# Altium footprint library 常用元件封装库.PcbLib: 1310 footprints (part 73 of 83)
Each footprint in its own frame and in the unit in brackets; x right, y up, seen from the top. Pads: shape width x height; smd on the part's side, far side on the other; paste and mask are expansions set on the pad; w line width, h text height; cw(c..) or ccw(c..) is an arc to the next point about the centre after c.
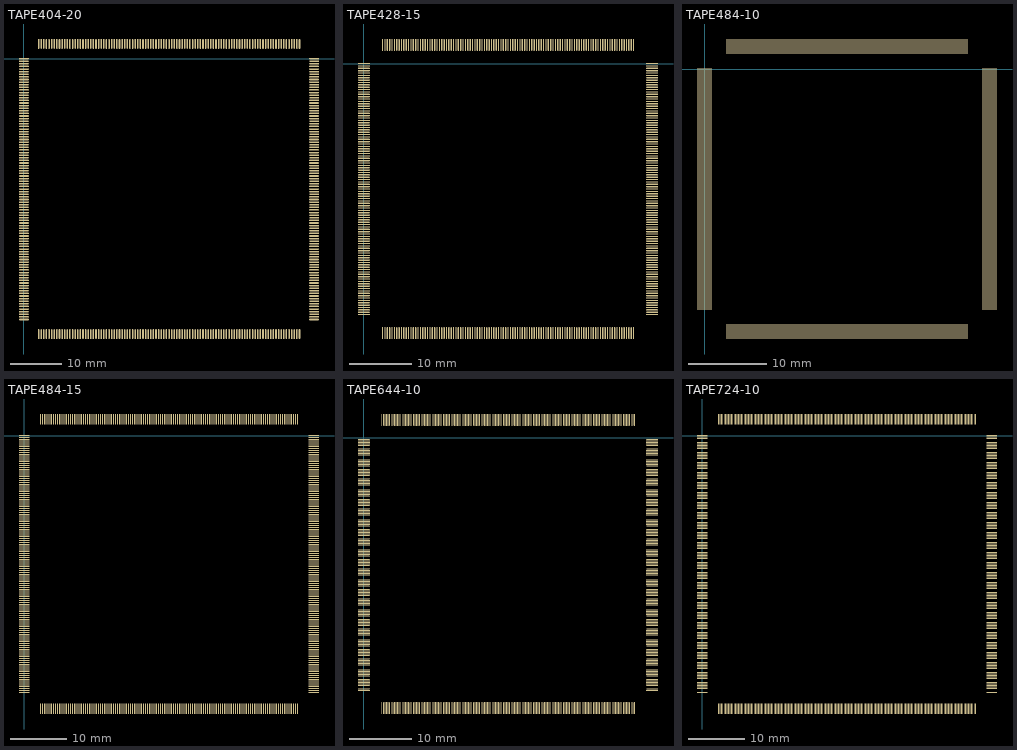
[diagram p72: the footprints below, top view; thin cyan lines are the x and y axes]

## TAPE404-20 [mil]
pads (404):
  oval 75x12 smd: 1(0,0) 2(0,-20) 3(0,-40) 4(0,-60) 5(0,-80) 6(0,-100) 7(0,-120) 8(0,-140) 9(0,-160) 10(0,-180) 11(0,-200) 12(0,-220) 13(0,-240) 14(0,-260) 15(0,-280) 16(0,-300) 17(0,-320) 18(0,-340) 19(0,-360) 20(0,-380) 21(0,-400) 22(0,-420) 23(0,-440) 24(0,-460) 25(0,-480) 26(0,-500) 27(0,-520) 28(0,-540) 29(0,-560) 30(0,-580) 31(0,-600) 32(0,-620) 33(0,-640) 34(0,-660) 35(0,-680) 36(0,-700) 37(0,-720) 38(0,-740) 39(0,-760) 40(0,-780) 41(0,-800) 42(0,-820) 43(0,-840) 44(0,-860) 45(0,-880) 46(0,-900) 47(0,-920) 48(0,-940) 49(0,-960) 50(0,-980) 51(0,-1000) 52(0,-1020) 53(0,-1040) 54(0,-1060) 55(0,-1080) 56(0,-1100) 57(0,-1120) 58(0,-1140) 59(0,-1160) 60(0,-1180) 61(0,-1200) 62(0,-1220) 63(0,-1240) 64(0,-1260) 65(0,-1280) 66(0,-1300) 67(0,-1320) 68(0,-1340) 69(0,-1360) 70(0,-1380) 71(0,-1400) 72(0,-1420) 73(0,-1440) 74(0,-1460) 75(0,-1480) 76(0,-1500) 77(0,-1520) 78(0,-1540) 79(0,-1560) 80(0,-1580) 81(0,-1600) 82(0,-1620) 83(0,-1640) 84(0,-1660) 85(0,-1680) 86(0,-1700) 87(0,-1720) 88(0,-1740) 89(0,-1760) 90(0,-1780) 91(0,-1800) 92(0,-1820) 93(0,-1840) 94(0,-1860) 95(0,-1880) 96(0,-1900) 97(0,-1920) 98(0,-1940) 99(0,-1960) 100(0,-1980) 101(0,-2000) 203(2225,-2000) 204(2225,-1980) 205(2225,-1960) 206(2225,-1940) 207(2225,-1920) 208(2225,-1900) 209(2225,-1880) 210(2225,-1860) 211(2225,-1840) 212(2225,-1820) 213(2225,-1800) 214(2225,-1780) 215(2225,-1760) 216(2225,-1740) 217(2225,-1720) 218(2225,-1700) 219(2225,-1680) 220(2225,-1660) 221(2225,-1640) 222(2225,-1620) 223(2225,-1600) 224(2225,-1580) 225(2225,-1560) 226(2225,-1540) 227(2225,-1520) 228(2225,-1500) 229(2225,-1480) 230(2225,-1460) 231(2225,-1440) 232(2225,-1420) 233(2225,-1400) 234(2225,-1380) 235(2225,-1360) 236(2225,-1340) 237(2225,-1320) 238(2225,-1300) 239(2225,-1280) 240(2225,-1260) 241(2225,-1240) 242(2225,-1220) 243(2225,-1200) 244(2225,-1180) 245(2225,-1160) 246(2225,-1140) 247(2225,-1120) 248(2225,-1100) 249(2225,-1080) 250(2225,-1060) 251(2225,-1040) 252(2225,-1020) 253(2225,-1000) 254(2225,-980) 255(2225,-960) 256(2225,-940) 257(2225,-920) 258(2225,-900) 259(2225,-880) 260(2225,-860) 261(2225,-840) 262(2225,-820) 263(2225,-800) 264(2225,-780) 265(2225,-760) 266(2225,-740) 267(2225,-720) 268(2225,-700) 269(2225,-680) 270(2225,-660) 271(2225,-640) 272(2225,-620) 273(2225,-600) 274(2225,-580) 275(2225,-560) 276(2225,-540) 277(2225,-520) 278(2225,-500) 279(2225,-480) 280(2225,-460) 281(2225,-440) 282(2225,-420) 283(2225,-400) 284(2225,-380) 285(2225,-360) 286(2225,-340) 287(2225,-320) 288(2225,-300) 289(2225,-280) 290(2225,-260) 291(2225,-240) 292(2225,-220) 293(2225,-200) 294(2225,-180) 295(2225,-160) 296(2225,-140) 297(2225,-120) 298(2225,-100) 299(2225,-80) 300(2225,-60) 301(2225,-40) 302(2225,-20) 303(2225,0)
  oval 12x75 smd: 102(113,-2112) 103(133,-2112) 104(153,-2112) 105(173,-2112) 106(193,-2112) 107(213,-2112) 108(233,-2112) 109(253,-2112) 110(273,-2112) 111(293,-2112) 112(313,-2112) 113(333,-2112) 114(353,-2112) 115(373,-2112) 116(393,-2112) 117(413,-2112) 118(433,-2112) 119(453,-2112) 120(473,-2112) 121(493,-2112) 122(513,-2112) 123(533,-2112) 124(553,-2112) 125(573,-2112) 126(593,-2112) 127(613,-2112) 128(633,-2112) 129(653,-2112) 130(673,-2112) 131(693,-2112) 132(713,-2112) 133(733,-2112) 134(753,-2112) 135(773,-2112) 136(793,-2112) 137(813,-2112) 138(833,-2112) 139(853,-2112) 140(873,-2112) 141(893,-2112) 142(913,-2112) 143(933,-2112) 144(953,-2112) 145(973,-2112) 146(993,-2112) 147(1013,-2112) 148(1033,-2112) 149(1053,-2112) 150(1073,-2112) 151(1093,-2112) 152(1113,-2112) 153(1133,-2112) 154(1153,-2112) 155(1173,-2112) 156(1193,-2112) 157(1213,-2112) 158(1233,-2112) 159(1253,-2112) 160(1273,-2112) 161(1293,-2112) 162(1313,-2112) 163(1333,-2112) 164(1353,-2112) 165(1373,-2112) 166(1393,-2112) 167(1413,-2112) 168(1433,-2112) 169(1453,-2112) 170(1473,-2112) 171(1493,-2112) 172(1513,-2112) 173(1533,-2112) 174(1553,-2112) 175(1573,-2112) 176(1593,-2112) 177(1613,-2112) 178(1633,-2112) 179(1653,-2112) 180(1673,-2112) 181(1693,-2112) 182(1713,-2112) 183(1733,-2112) 184(1753,-2112) 185(1773,-2112) 186(1793,-2112) 187(1813,-2112) 188(1833,-2112) 189(1853,-2112) 190(1873,-2112) 191(1893,-2112) 192(1913,-2112) 193(1933,-2112) 194(1953,-2112) 195(1973,-2112) 196(1993,-2112) 197(2013,-2112) 198(2033,-2112) 199(2053,-2112) 200(2073,-2112) 201(2093,-2112) 202(2113,-2112) 304(2113,113) 305(2093,113) 306(2073,113) 307(2053,113) 308(2033,113) 309(2013,113) 310(1993,113) 311(1973,113) 312(1953,113) 313(1933,113) 314(1913,113) 315(1893,113) 316(1873,113) 317(1853,113) 318(1833,113) 319(1813,113) 320(1793,113) 321(1773,113) 322(1753,113) 323(1733,113) 324(1713,113) 325(1693,113) 326(1673,113) 327(1653,113) 328(1633,113) 329(1613,113) 330(1593,113) 331(1573,113) 332(1553,113) 333(1533,113) 334(1513,113) 335(1493,113) 336(1473,113) 337(1453,113) 338(1433,113) 339(1413,113) 340(1393,113) 341(1373,113) 342(1353,113) 343(1333,113) 344(1313,113) 345(1293,113) 346(1273,113) 347(1253,113) 348(1233,113) 349(1213,113) 350(1193,113) 351(1173,113) 352(1153,113) 353(1133,113) 354(1113,113) 355(1093,113) 356(1073,113) 357(1053,113) 358(1033,113) 359(1013,113) 360(993,113) 361(973,113) 362(953,113) 363(933,113) 364(913,113) 365(893,113) 366(873,113) 367(853,113) 368(833,113) 369(813,113) 370(793,113) 371(773,113) 372(753,113) 373(733,113) 374(713,113) 375(693,113) 376(673,113) 377(653,113) 378(633,113) 379(613,113) 380(593,113) 381(573,113) 382(553,113) 383(533,113) 384(513,113) 385(493,113) 386(473,113) 387(453,113) 388(433,113) 389(413,113) 390(393,113) 391(373,113) 392(353,113) 393(333,113) 394(313,113) 395(293,113) 396(273,113) 397(253,113) 398(233,113) 399(213,113) 400(193,113) 401(173,113) 402(153,113) 403(133,113) 404(113,113)

## TAPE428-15 [mil]
pads (428):
  oval 75x8 smd: 1(0,0) 2(0,-15) 3(0,-30) 4(0,-45) 5(0,-60) 6(0,-75) 7(0,-90) 8(0,-105) 9(0,-120) 10(0,-135) 11(0,-150) 12(0,-165) 13(0,-180) 14(0,-195) 15(0,-210) 16(0,-225) 17(0,-240) 18(0,-255) 19(0,-270) 20(0,-285) 21(0,-300) 22(0,-315) 23(0,-330) 24(0,-345) 25(0,-360) 26(0,-375) 27(0,-390) 28(0,-405) 29(0,-420) 30(0,-435) 31(0,-450) 32(0,-465) 33(0,-480) 34(0,-495) 35(0,-510) 36(0,-525) 37(0,-540) 38(0,-555) 39(0,-570) 40(0,-585) 41(0,-600) 42(0,-615) 43(0,-630) 44(0,-645) 45(0,-660) 46(0,-675) 47(0,-690) 48(0,-705) 49(0,-720) 50(0,-735) 51(0,-750) 52(0,-765) 53(0,-780) 54(0,-795) 55(0,-810) 56(0,-825) 57(0,-840) 58(0,-855) 59(0,-870) 60(0,-885) 61(0,-900) 62(0,-915) 63(0,-930) 64(0,-945) 65(0,-960) 66(0,-975) 67(0,-990) 68(0,-1005) 69(0,-1020) 70(0,-1035) 71(0,-1050) 72(0,-1065) 73(0,-1080) 74(0,-1095) 75(0,-1110) 76(0,-1125) 77(0,-1140) 78(0,-1155) 79(0,-1170) 80(0,-1185) 81(0,-1200) 82(0,-1215) 83(0,-1230) 84(0,-1245) 85(0,-1260) 86(0,-1275) 87(0,-1290) 88(0,-1305) 89(0,-1320) 90(0,-1335) 91(0,-1350) 92(0,-1365) 93(0,-1380) 94(0,-1395) 95(0,-1410) 96(0,-1425) 97(0,-1440) 98(0,-1455) 99(0,-1470) 100(0,-1485) 101(0,-1500) 102(0,-1515) 103(0,-1530) 104(0,-1545) 105(0,-1560) 106(0,-1575) 107(0,-1590) 215(1825,-1590) 216(1825,-1575) 217(1825,-1560) 218(1825,-1545) 219(1825,-1530) 220(1825,-1515) 221(1825,-1500) 222(1825,-1485) 223(1825,-1470) 224(1825,-1455) 225(1825,-1440) 226(1825,-1425) 227(1825,-1410) 228(1825,-1395) 229(1825,-1380) 230(1825,-1365) 231(1825,-1350) 232(1825,-1335) 233(1825,-1320) 234(1825,-1305) 235(1825,-1290) 236(1825,-1275) 237(1825,-1260) 238(1825,-1245) 239(1825,-1230) 240(1825,-1215) 241(1825,-1200) 242(1825,-1185) 243(1825,-1170) 244(1825,-1155) 245(1825,-1140) 246(1825,-1125) 247(1825,-1110) 248(1825,-1095) 249(1825,-1080) 250(1825,-1065) 251(1825,-1050) 252(1825,-1035) 253(1825,-1020) 254(1825,-1005) 255(1825,-990) 256(1825,-975) 257(1825,-960) 258(1825,-945) 259(1825,-930) 260(1825,-915) 261(1825,-900) 262(1825,-885) 263(1825,-870) 264(1825,-855) 265(1825,-840) 266(1825,-825) 267(1825,-810) 268(1825,-795) 269(1825,-780) 270(1825,-765) 271(1825,-750) 272(1825,-735) 273(1825,-720) 274(1825,-705) 275(1825,-690) 276(1825,-675) 277(1825,-660) 278(1825,-645) 279(1825,-630) 280(1825,-615) 281(1825,-600) 282(1825,-585) 283(1825,-570) 284(1825,-555) 285(1825,-540) 286(1825,-525) 287(1825,-510) 288(1825,-495) 289(1825,-480) 290(1825,-465) 291(1825,-450) 292(1825,-435) 293(1825,-420) 294(1825,-405) 295(1825,-390) 296(1825,-375) 297(1825,-360) 298(1825,-345) 299(1825,-330) 300(1825,-315) 301(1825,-300) 302(1825,-285) 303(1825,-270) 304(1825,-255) 305(1825,-240) 306(1825,-225) 307(1825,-210) 308(1825,-195) 309(1825,-180) 310(1825,-165) 311(1825,-150) 312(1825,-135) 313(1825,-120) 314(1825,-105) 315(1825,-90) 316(1825,-75) 317(1825,-60) 318(1825,-45) 319(1825,-30) 320(1825,-15) 321(1825,0)
  oval 8x75 smd: 108(118,-1707) 109(133,-1707) 110(148,-1707) 111(163,-1707) 112(178,-1707) 113(193,-1707) 114(208,-1707) 115(223,-1707) 116(238,-1707) 117(253,-1707) 118(268,-1707) 119(283,-1707) 120(298,-1707) 121(313,-1707) 122(328,-1707) 123(343,-1707) 124(358,-1707) 125(373,-1707) 126(388,-1707) 127(403,-1707) 128(418,-1707) 129(433,-1707) 130(448,-1707) 131(463,-1707) 132(478,-1707) 133(493,-1707) 134(508,-1707) 135(523,-1707) 136(538,-1707) 137(553,-1707) 138(568,-1707) 139(583,-1707) 140(598,-1707) 141(613,-1707) 142(628,-1707) 143(643,-1707) 144(658,-1707) 145(673,-1707) 146(688,-1707) 147(703,-1707) 148(718,-1707) 149(733,-1707) 150(748,-1707) 151(763,-1707) 152(778,-1707) 153(793,-1707) 154(808,-1707) 155(823,-1707) 156(838,-1707) 157(853,-1707) 158(868,-1707) 159(883,-1707) 160(898,-1707) 161(913,-1707) 162(928,-1707) 163(943,-1707) 164(958,-1707) 165(973,-1707) 166(988,-1707) 167(1003,-1707) 168(1018,-1707) 169(1033,-1707) 170(1048,-1707) 171(1063,-1707) 172(1078,-1707) 173(1093,-1707) 174(1108,-1707) 175(1123,-1707) 176(1138,-1707) 177(1153,-1707) 178(1168,-1707) 179(1183,-1707) 180(1198,-1707) 181(1213,-1707) 182(1228,-1707) 183(1243,-1707) 184(1258,-1707) 185(1273,-1707) 186(1288,-1707) 187(1303,-1707) 188(1318,-1707) 189(1333,-1707) 190(1348,-1707) 191(1363,-1707) 192(1378,-1707) 193(1393,-1707) 194(1408,-1707) 195(1423,-1707) 196(1438,-1707) 197(1453,-1707) 198(1468,-1707) 199(1483,-1707) 200(1498,-1707) 201(1513,-1707) 202(1528,-1707) 203(1543,-1707) 204(1558,-1707) 205(1573,-1707) 206(1588,-1707) 207(1603,-1707) 208(1618,-1707) 209(1633,-1707) 210(1648,-1707) 211(1663,-1707) 212(1678,-1707) 213(1693,-1707) 214(1708,-1707) 322(1708,118) 323(1693,118) 324(1678,118) 325(1663,118) 326(1648,118) 327(1633,118) 328(1618,118) 329(1603,118) 330(1588,118) 331(1573,118) 332(1558,118) 333(1543,118) 334(1528,118) 335(1513,118) 336(1498,118) 337(1483,118) 338(1468,118) 339(1453,118) 340(1438,118) 341(1423,118) 342(1408,118) 343(1393,118) 344(1378,118) 345(1363,118) 346(1348,118) 347(1333,118) 348(1318,118) 349(1303,118) 350(1288,118) 351(1273,118) 352(1258,118) 353(1243,118) 354(1228,118) 355(1213,118) 356(1198,118) 357(1183,118) 358(1168,118) 359(1153,118) 360(1138,118) 361(1123,118) 362(1108,118) 363(1093,118) 364(1078,118) 365(1063,118) 366(1048,118) 367(1033,118) 368(1018,118) 369(1003,118) 370(988,118) 371(973,118) 372(958,118) 373(943,118) 374(928,118) 375(913,118) 376(898,118) 377(883,118) 378(868,118) 379(853,118) 380(838,118) 381(823,118) 382(808,118) 383(793,118) 384(778,118) 385(763,118) 386(748,118) 387(733,118) 388(718,118) 389(703,118) 390(688,118) 391(673,118) 392(658,118) 393(643,118) 394(628,118) 395(613,118) 396(598,118) 397(583,118) 398(568,118) 399(553,118) 400(538,118) 401(523,118) 402(508,118) 403(493,118) 404(478,118) 405(463,118) 406(448,118) 407(433,118) 408(418,118) 409(403,118) 410(388,118) 411(373,118) 412(358,118) 413(343,118) 414(328,118) 415(313,118) 416(298,118) 417(283,118) 418(268,118) 419(253,118) 420(238,118) 421(223,118) 422(208,118) 423(193,118) 424(178,118) 425(163,118) 426(148,118) 427(133,118) 428(118,118)

## TAPE484-10 [mil]
pads (484):
  oval 75x5 smd: 1(0,0) 2(0,-10) 3(0,-20) 4(0,-30) 5(0,-40) 6(0,-50) 7(0,-60) 8(0,-70) 9(0,-80) 10(0,-90) 11(0,-100) 12(0,-110) 13(0,-120) 14(0,-130) 15(0,-140) 16(0,-150) 17(0,-160) 18(0,-170) 19(0,-180) 20(0,-190) 21(0,-200) 22(0,-210) 23(0,-220) 24(0,-230) 25(0,-240) 26(0,-250) 27(0,-260) 28(0,-270) 29(0,-280) 30(0,-290) 31(0,-300) 32(0,-310) 33(0,-320) 34(0,-330) 35(0,-340) 36(0,-350) 37(0,-360) 38(0,-370) 39(0,-380) 40(0,-390) 41(0,-400) 42(0,-410) 43(0,-420) 44(0,-430) 45(0,-440) 46(0,-450) 47(0,-460) 48(0,-470) 49(0,-480) 50(0,-490) 51(0,-500) 52(0,-510) 53(0,-520) 54(0,-530) 55(0,-540) 56(0,-550) 57(0,-560) 58(0,-570) 59(0,-580) 60(0,-590) 61(0,-600) 62(0,-610) 63(0,-620) 64(0,-630) 65(0,-640) 66(0,-650) 67(0,-660) 68(0,-670) 69(0,-680) 70(0,-690) 71(0,-700) 72(0,-710) 73(0,-720) 74(0,-730) 75(0,-740) 76(0,-750) 77(0,-760) 78(0,-770) 79(0,-780) 80(0,-790) 81(0,-800) 82(0,-810) 83(0,-820) 84(0,-830) 85(0,-840) 86(0,-850) 87(0,-860) 88(0,-870) 89(0,-880) 90(0,-890) 91(0,-900) 92(0,-910) 93(0,-920) 94(0,-930) 95(0,-940) 96(0,-950) 97(0,-960) 98(0,-970) 99(0,-980) 100(0,-990) 101(0,-1000) 102(0,-1010) 103(0,-1020) 104(0,-1030) 105(0,-1040) 106(0,-1050) 107(0,-1060) 108(0,-1070) 109(0,-1080) 110(0,-1090) 111(0,-1100) 112(0,-1110) 113(0,-1120) 114(0,-1130) 115(0,-1140) 116(0,-1150) 117(0,-1160) 118(0,-1170) 119(0,-1180) 120(0,-1190) 121(0,-1200) 243(1425,-1200) 244(1425,-1190) 245(1425,-1180) 246(1425,-1170) 247(1425,-1160) 248(1425,-1150) 249(1425,-1140) 250(1425,-1130) 251(1425,-1120) 252(1425,-1110) 253(1425,-1100) 254(1425,-1090) 255(1425,-1080) 256(1425,-1070) 257(1425,-1060) 258(1425,-1050) 259(1425,-1040) 260(1425,-1030) 261(1425,-1020) 262(1425,-1010) 263(1425,-1000) 264(1425,-990) 265(1425,-980) 266(1425,-970) 267(1425,-960) 268(1425,-950) 269(1425,-940) 270(1425,-930) 271(1425,-920) 272(1425,-910) 273(1425,-900) 274(1425,-890) 275(1425,-880) 276(1425,-870) 277(1425,-860) 278(1425,-850) 279(1425,-840) 280(1425,-830) 281(1425,-820) 282(1425,-810) 283(1425,-800) 284(1425,-790) 285(1425,-780) 286(1425,-770) 287(1425,-760) 288(1425,-750) 289(1425,-740) 290(1425,-730) 291(1425,-720) 292(1425,-710) 293(1425,-700) 294(1425,-690) 295(1425,-680) 296(1425,-670) 297(1425,-660) 298(1425,-650) 299(1425,-640) 300(1425,-630) 301(1425,-620) 302(1425,-610) 303(1425,-600) 304(1425,-590) 305(1425,-580) 306(1425,-570) 307(1425,-560) 308(1425,-550) 309(1425,-540) 310(1425,-530) 311(1425,-520) 312(1425,-510) 313(1425,-500) 314(1425,-490) 315(1425,-480) 316(1425,-470) 317(1425,-460) 318(1425,-450) 319(1425,-440) 320(1425,-430) 321(1425,-420) 322(1425,-410) 323(1425,-400) 324(1425,-390) 325(1425,-380) 326(1425,-370) 327(1425,-360) 328(1425,-350) 329(1425,-340) 330(1425,-330) 331(1425,-320) 332(1425,-310) 333(1425,-300) 334(1425,-290) 335(1425,-280) 336(1425,-270) 337(1425,-260) 338(1425,-250) 339(1425,-240) 340(1425,-230) 341(1425,-220) 342(1425,-210) 343(1425,-200) 344(1425,-190) 345(1425,-180) 346(1425,-170) 347(1425,-160) 348(1425,-150) 349(1425,-140) 350(1425,-130) 351(1425,-120) 352(1425,-110) 353(1425,-100) 354(1425,-90) 355(1425,-80) 356(1425,-70) 357(1425,-60) 358(1425,-50) 359(1425,-40) 360(1425,-30) 361(1425,-20) 362(1425,-10) 363(1425,0)
  oval 5x75 smd: 122(113,-1312) 123(123,-1312) 124(133,-1312) 125(143,-1312) 126(153,-1312) 127(163,-1312) 128(173,-1312) 129(183,-1312) 130(193,-1312) 131(203,-1312) 132(213,-1312) 133(223,-1312) 134(233,-1312) 135(243,-1312) 136(253,-1312) 137(263,-1312) 138(273,-1312) 139(283,-1312) 140(293,-1312) 141(303,-1312) 142(313,-1312) 143(323,-1312) 144(333,-1312) 145(343,-1312) 146(353,-1312) 147(363,-1312) 148(373,-1312) 149(383,-1312) 150(393,-1312) 151(403,-1312) 152(413,-1312) 153(423,-1312) 154(433,-1312) 155(443,-1312) 156(453,-1312) 157(463,-1312) 158(473,-1312) 159(483,-1312) 160(493,-1312) 161(503,-1312) 162(513,-1312) 163(523,-1312) 164(533,-1312) 165(543,-1312) 166(553,-1312) 167(563,-1312) 168(573,-1312) 169(583,-1312) 170(593,-1312) 171(603,-1312) 172(613,-1312) 173(623,-1312) 174(633,-1312) 175(643,-1312) 176(653,-1312) 177(663,-1312) 178(673,-1312) 179(683,-1312) 180(693,-1312) 181(703,-1312) 182(713,-1312) 183(723,-1312) 184(733,-1312) 185(743,-1312) 186(753,-1312) 187(763,-1312) 188(773,-1312) 189(783,-1312) 190(793,-1312) 191(803,-1312) 192(813,-1312) 193(823,-1312) 194(833,-1312) 195(843,-1312) 196(853,-1312) 197(863,-1312) 198(873,-1312) 199(883,-1312) 200(893,-1312) 201(903,-1312) 202(913,-1312) 203(923,-1312) 204(933,-1312) 205(943,-1312) 206(953,-1312) 207(963,-1312) 208(973,-1312) 209(983,-1312) 210(993,-1312) 211(1003,-1312) 212(1013,-1312) 213(1023,-1312) 214(1033,-1312) 215(1043,-1312) 216(1053,-1312) 217(1063,-1312) 218(1073,-1312) 219(1083,-1312) 220(1093,-1312) 221(1103,-1312) 222(1113,-1312) 223(1123,-1312) 224(1133,-1312) 225(1143,-1312) 226(1153,-1312) 227(1163,-1312) 228(1173,-1312) 229(1183,-1312) 230(1193,-1312) 231(1203,-1312) 232(1213,-1312) 233(1223,-1312) 234(1233,-1312) 235(1243,-1312) 236(1253,-1312) 237(1263,-1312) 238(1273,-1312) 239(1283,-1312) 240(1293,-1312) 241(1303,-1312) 242(1313,-1312) 364(1313,113) 365(1303,113) 366(1293,113) 367(1283,113) 368(1273,113) 369(1263,113) 370(1253,113) 371(1243,113) 372(1233,113) 373(1223,113) 374(1213,113) 375(1203,113) 376(1193,113) 377(1183,113) 378(1173,113) 379(1163,113) 380(1153,113) 381(1143,113) 382(1133,113) 383(1123,113) 384(1113,113) 385(1103,113) 386(1093,113) 387(1083,113) 388(1073,113) 389(1063,113) 390(1053,113) 391(1043,113) 392(1033,113) 393(1023,113) 394(1013,113) 395(1003,113) 396(993,113) 397(983,113) 398(973,113) 399(963,113) 400(953,113) 401(943,113) 402(933,113) 403(923,113) 404(913,113) 405(903,113) 406(893,113) 407(883,113) 408(873,113) 409(863,113) 410(853,113) 411(843,113) 412(833,113) 413(823,113) 414(813,113) 415(803,113) 416(793,113) 417(783,113) 418(773,113) 419(763,113) 420(753,113) 421(743,113) 422(733,113) 423(723,113) 424(713,113) 425(703,113) 426(693,113) 427(683,113) 428(673,113) 429(663,113) 430(653,113) 431(643,113) 432(633,113) 433(623,113) 434(613,113) 435(603,113) 436(593,113) 437(583,113) 438(573,113) 439(563,113) 440(553,113) 441(543,113) 442(533,113) 443(523,113) 444(513,113) 445(503,113) 446(493,113) 447(483,113) 448(473,113) 449(463,113) 450(453,113) 451(443,113) 452(433,113) 453(423,113) 454(413,113) 455(403,113) 456(393,113) 457(383,113) 458(373,113) 459(363,113) 460(353,113) 461(343,113) 462(333,113) 463(323,113) 464(313,113) 465(303,113) 466(293,113) 467(283,113) 468(273,113) 469(263,113) 470(253,113) 471(243,113) 472(233,113) 473(223,113) 474(213,113) 475(203,113) 476(193,113) 477(183,113) 478(173,113) 479(163,113) 480(153,113) 481(143,113) 482(133,113) 483(123,113) 484(113,113)

## TAPE484-15 [mil]
pads (484):
  oval 75x8 smd: 1(0,0) 2(0,-15) 3(0,-30) 4(0,-45) 5(0,-60) 6(0,-75) 7(0,-90) 8(0,-105) 9(0,-120) 10(0,-135) 11(0,-150) 12(0,-165) 13(0,-180) 14(0,-195) 15(0,-210) 16(0,-225) 17(0,-240) 18(0,-255) 19(0,-270) 20(0,-285) 21(0,-300) 22(0,-315) 23(0,-330) 24(0,-345) 25(0,-360) 26(0,-375) 27(0,-390) 28(0,-405) 29(0,-420) 30(0,-435) 31(0,-450) 32(0,-465) 33(0,-480) 34(0,-495) 35(0,-510) 36(0,-525) 37(0,-540) 38(0,-555) 39(0,-570) 40(0,-585) 41(0,-600) 42(0,-615) 43(0,-630) 44(0,-645) 45(0,-660) 46(0,-675) 47(0,-690) 48(0,-705) 49(0,-720) 50(0,-735) 51(0,-750) 52(0,-765) 53(0,-780) 54(0,-795) 55(0,-810) 56(0,-825) 57(0,-840) 58(0,-855) 59(0,-870) 60(0,-885) 61(0,-900) 62(0,-915) 63(0,-930) 64(0,-945) 65(0,-960) 66(0,-975) 67(0,-990) 68(0,-1005) 69(0,-1020) 70(0,-1035) 71(0,-1050) 72(0,-1065) 73(0,-1080) 74(0,-1095) 75(0,-1110) 76(0,-1125) 77(0,-1140) 78(0,-1155) 79(0,-1170) 80(0,-1185) 81(0,-1200) 82(0,-1215) 83(0,-1230) 84(0,-1245) 85(0,-1260) 86(0,-1275) 87(0,-1290) 88(0,-1305) 89(0,-1320) 90(0,-1335) 91(0,-1350) 92(0,-1365) 93(0,-1380) 94(0,-1395) 95(0,-1410) 96(0,-1425) 97(0,-1440) 98(0,-1455) 99(0,-1470) 100(0,-1485) 101(0,-1500) 102(0,-1515) 103(0,-1530) 104(0,-1545) 105(0,-1560) 106(0,-1575) 107(0,-1590) 108(0,-1605) 109(0,-1620) 110(0,-1635) 111(0,-1650) 112(0,-1665) 113(0,-1680) 114(0,-1695) 115(0,-1710) 116(0,-1725) 117(0,-1740) 118(0,-1755) 119(0,-1770) 120(0,-1785) 121(0,-1800) 243(2025,-1800) 244(2025,-1785) 245(2025,-1770) 246(2025,-1755) 247(2025,-1740) 248(2025,-1725) 249(2025,-1710) 250(2025,-1695) 251(2025,-1680) 252(2025,-1665) 253(2025,-1650) 254(2025,-1635) 255(2025,-1620) 256(2025,-1605) 257(2025,-1590) 258(2025,-1575) 259(2025,-1560) 260(2025,-1545) 261(2025,-1530) 262(2025,-1515) 263(2025,-1500) 264(2025,-1485) 265(2025,-1470) 266(2025,-1455) 267(2025,-1440) 268(2025,-1425) 269(2025,-1410) 270(2025,-1395) 271(2025,-1380) 272(2025,-1365) 273(2025,-1350) 274(2025,-1335) 275(2025,-1320) 276(2025,-1305) 277(2025,-1290) 278(2025,-1275) 279(2025,-1260) 280(2025,-1245) 281(2025,-1230) 282(2025,-1215) 283(2025,-1200) 284(2025,-1185) 285(2025,-1170) 286(2025,-1155) 287(2025,-1140) 288(2025,-1125) 289(2025,-1110) 290(2025,-1095) 291(2025,-1080) 292(2025,-1065) 293(2025,-1050) 294(2025,-1035) 295(2025,-1020) 296(2025,-1005) 297(2025,-990) 298(2025,-975) 299(2025,-960) 300(2025,-945) 301(2025,-930) 302(2025,-915) 303(2025,-900) 304(2025,-885) 305(2025,-870) 306(2025,-855) 307(2025,-840) 308(2025,-825) 309(2025,-810) 310(2025,-795) 311(2025,-780) 312(2025,-765) 313(2025,-750) 314(2025,-735) 315(2025,-720) 316(2025,-705) 317(2025,-690) 318(2025,-675) 319(2025,-660) 320(2025,-645) 321(2025,-630) 322(2025,-615) 323(2025,-600) 324(2025,-585) 325(2025,-570) 326(2025,-555) 327(2025,-540) 328(2025,-525) 329(2025,-510) 330(2025,-495) 331(2025,-480) 332(2025,-465) 333(2025,-450) 334(2025,-435) 335(2025,-420) 336(2025,-405) 337(2025,-390) 338(2025,-375) 339(2025,-360) 340(2025,-345) 341(2025,-330) 342(2025,-315) 343(2025,-300) 344(2025,-285) 345(2025,-270) 346(2025,-255) 347(2025,-240) 348(2025,-225) 349(2025,-210) 350(2025,-195) 351(2025,-180) 352(2025,-165) 353(2025,-150) 354(2025,-135) 355(2025,-120) 356(2025,-105) 357(2025,-90) 358(2025,-75) 359(2025,-60) 360(2025,-45) 361(2025,-30) 362(2025,-15) 363(2025,0)
  oval 8x75 smd: 122(113,-1912) 123(128,-1912) 124(143,-1912) 125(158,-1912) 126(173,-1912) 127(188,-1912) 128(203,-1912) 129(218,-1912) 130(233,-1912) 131(248,-1912) 132(263,-1912) 133(278,-1912) 134(293,-1912) 135(308,-1912) 136(323,-1912) 137(338,-1912) 138(353,-1912) 139(368,-1912) 140(383,-1912) 141(398,-1912) 142(413,-1912) 143(428,-1912) 144(443,-1912) 145(458,-1912) 146(473,-1912) 147(488,-1912) 148(503,-1912) 149(518,-1912) 150(533,-1912) 151(548,-1912) 152(563,-1912) 153(578,-1912) 154(593,-1912) 155(608,-1912) 156(623,-1912) 157(638,-1912) 158(653,-1912) 159(668,-1912) 160(683,-1912) 161(698,-1912) 162(713,-1912) 163(728,-1912) 164(743,-1912) 165(758,-1912) 166(773,-1912) 167(788,-1912) 168(803,-1912) 169(818,-1912) 170(833,-1912) 171(848,-1912) 172(863,-1912) 173(878,-1912) 174(893,-1912) 175(908,-1912) 176(923,-1912) 177(938,-1912) 178(953,-1912) 179(968,-1912) 180(983,-1912) 181(998,-1912) 182(1013,-1912) 183(1028,-1912) 184(1043,-1912) 185(1058,-1912) 186(1073,-1912) 187(1088,-1912) 188(1103,-1912) 189(1118,-1912) 190(1133,-1912) 191(1148,-1912) 192(1163,-1912) 193(1178,-1912) 194(1193,-1912) 195(1208,-1912) 196(1223,-1912) 197(1238,-1912) 198(1253,-1912) 199(1268,-1912) 200(1283,-1912) 201(1298,-1912) 202(1313,-1912) 203(1328,-1912) 204(1343,-1912) 205(1358,-1912) 206(1373,-1912) 207(1388,-1912) 208(1403,-1912) 209(1418,-1912) 210(1433,-1912) 211(1448,-1912) 212(1463,-1912) 213(1478,-1912) 214(1493,-1912) 215(1508,-1912) 216(1523,-1912) 217(1538,-1912) 218(1553,-1912) 219(1568,-1912) 220(1583,-1912) 221(1598,-1912) 222(1613,-1912) 223(1628,-1912) 224(1643,-1912) 225(1658,-1912) 226(1673,-1912) 227(1688,-1912) 228(1703,-1912) 229(1718,-1912) 230(1733,-1912) 231(1748,-1912) 232(1763,-1912) 233(1778,-1912) 234(1793,-1912) 235(1808,-1912) 236(1823,-1912) 237(1838,-1912) 238(1853,-1912) 239(1868,-1912) 240(1883,-1912) 241(1898,-1912) 242(1913,-1912) 364(1913,113) 365(1898,113) 366(1883,113) 367(1868,113) 368(1853,113) 369(1838,113) 370(1823,113) 371(1808,113) 372(1793,113) 373(1778,113) 374(1763,113) 375(1748,113) 376(1733,113) 377(1718,113) 378(1703,113) 379(1688,113) 380(1673,113) 381(1658,113) 382(1643,113) 383(1628,113) 384(1613,113) 385(1598,113) 386(1583,113) 387(1568,113) 388(1553,113) 389(1538,113) 390(1523,113) 391(1508,113) 392(1493,113) 393(1478,113) 394(1463,113) 395(1448,113) 396(1433,113) 397(1418,113) 398(1403,113) 399(1388,113) 400(1373,113) 401(1358,113) 402(1343,113) 403(1328,113) 404(1313,113) 405(1298,113) 406(1283,113) 407(1268,113) 408(1253,113) 409(1238,113) 410(1223,113) 411(1208,113) 412(1193,113) 413(1178,113) 414(1163,113) 415(1148,113) 416(1133,113) 417(1118,113) 418(1103,113) 419(1088,113) 420(1073,113) 421(1058,113) 422(1043,113) 423(1028,113) 424(1013,113) 425(998,113) 426(983,113) 427(968,113) 428(953,113) 429(938,113) 430(923,113) 431(908,113) 432(893,113) 433(878,113) 434(863,113) 435(848,113) 436(833,113) 437(818,113) 438(803,113) 439(788,113) 440(773,113) 441(758,113) 442(743,113) 443(728,113) 444(713,113) 445(698,113) 446(683,113) 447(668,113) 448(653,113) 449(638,113) 450(623,113) 451(608,113) 452(593,113) 453(578,113) 454(563,113) 455(548,113) 456(533,113) 457(518,113) 458(503,113) 459(488,113) 460(473,113) 461(458,113) 462(443,113) 463(428,113) 464(413,113) 465(398,113) 466(383,113) 467(368,113) 468(353,113) 469(338,113) 470(323,113) 471(308,113) 472(293,113) 473(278,113) 474(263,113) 475(248,113) 476(233,113) 477(218,113) 478(203,113) 479(188,113) 480(173,113) 481(158,113) 482(143,113) 483(128,113) 484(113,113)

## TAPE644-10 [mil]
pads (644):
  oval 75x5 smd: 1(0,0) 2(0,-10) 3(0,-20) 4(0,-30) 5(0,-40) 6(0,-50) 7(0,-60) 8(0,-70) 9(0,-80) 10(0,-90) 11(0,-100) 12(0,-110) 13(0,-120) 14(0,-130) 15(0,-140) 16(0,-150) 17(0,-160) 18(0,-170) 19(0,-180) 20(0,-190) 21(0,-200) 22(0,-210) 23(0,-220) 24(0,-230) 25(0,-240) 26(0,-250) 27(0,-260) 28(0,-270) 29(0,-280) 30(0,-290) 31(0,-300) 32(0,-310) 33(0,-320) 34(0,-330) 35(0,-340) 36(0,-350) 37(0,-360) 38(0,-370) 39(0,-380) 40(0,-390) 41(0,-400) 42(0,-410) 43(0,-420) 44(0,-430) 45(0,-440) 46(0,-450) 47(0,-460) 48(0,-470) 49(0,-480) 50(0,-490) 51(0,-500) 52(0,-510) 53(0,-520) 54(0,-530) 55(0,-540) 56(0,-550) 57(0,-560) 58(0,-570) 59(0,-580) 60(0,-590) 61(0,-600) 62(0,-610) 63(0,-620) 64(0,-630) 65(0,-640) 66(0,-650) 67(0,-660) 68(0,-670) 69(0,-680) 70(0,-690) 71(0,-700) 72(0,-710) 73(0,-720) 74(0,-730) 75(0,-740) 76(0,-750) 77(0,-760) 78(0,-770) 79(0,-780) 80(0,-790) 81(0,-800) 82(0,-810) 83(0,-820) 84(0,-830) 85(0,-840) 86(0,-850) 87(0,-860) 88(0,-870) 89(0,-880) 90(0,-890) 91(0,-900) 92(0,-910) 93(0,-920) 94(0,-930) 95(0,-940) 96(0,-950) 97(0,-960) 98(0,-970) 99(0,-980) 100(0,-990) 101(0,-1000) 102(0,-1010) 103(0,-1020) 104(0,-1030) 105(0,-1040) 106(0,-1050) 107(0,-1060) 108(0,-1070) 109(0,-1080) 110(0,-1090) 111(0,-1100) 112(0,-1110) 113(0,-1120) 114(0,-1130) 115(0,-1140) 116(0,-1150) 117(0,-1160) 118(0,-1170) 119(0,-1180) 120(0,-1190) 121(0,-1200) 122(0,-1210) 123(0,-1220) 124(0,-1230) 125(0,-1240) 126(0,-1250) 127(0,-1260) 128(0,-1270) 129(0,-1280) 130(0,-1290) 131(0,-1300) 132(0,-1310) 133(0,-1320) 134(0,-1330) 135(0,-1340) 136(0,-1350) 137(0,-1360) 138(0,-1370) 139(0,-1380) 140(0,-1390) 141(0,-1400) 142(0,-1410) 143(0,-1420) 144(0,-1430) 145(0,-1440) 146(0,-1450) 147(0,-1460) 148(0,-1470) 149(0,-1480) 150(0,-1490) 151(0,-1500) 152(0,-1510) 153(0,-1520) 154(0,-1530) 155(0,-1540) 156(0,-1550) 157(0,-1560) 158(0,-1570) 159(0,-1580) 160(0,-1590) 161(0,-1600) 323(1825,-1600) 324(1825,-1590) 325(1825,-1580) 326(1825,-1570) 327(1825,-1560) 328(1825,-1550) 329(1825,-1540) 330(1825,-1530) 331(1825,-1520) 332(1825,-1510) 333(1825,-1500) 334(1825,-1490) 335(1825,-1480) 336(1825,-1470) 337(1825,-1460) 338(1825,-1450) 339(1825,-1440) 340(1825,-1430) 341(1825,-1420) 342(1825,-1410) 343(1825,-1400) 344(1825,-1390) 345(1825,-1380) 346(1825,-1370) 347(1825,-1360) 348(1825,-1350) 349(1825,-1340) 350(1825,-1330) 351(1825,-1320) 352(1825,-1310) 353(1825,-1300) 354(1825,-1290) 355(1825,-1280) 356(1825,-1270) 357(1825,-1260) 358(1825,-1250) 359(1825,-1240) 360(1825,-1230) 361(1825,-1220) 362(1825,-1210) 363(1825,-1200) 364(1825,-1190) 365(1825,-1180) 366(1825,-1170) 367(1825,-1160) 368(1825,-1150) 369(1825,-1140) 370(1825,-1130) 371(1825,-1120) 372(1825,-1110) 373(1825,-1100) 374(1825,-1090) 375(1825,-1080) 376(1825,-1070) 377(1825,-1060) 378(1825,-1050) 379(1825,-1040) 380(1825,-1030) 381(1825,-1020) 382(1825,-1010) 383(1825,-1000) 384(1825,-990) 385(1825,-980) 386(1825,-970) 387(1825,-960) 388(1825,-950) 389(1825,-940) 390(1825,-930) 391(1825,-920) 392(1825,-910) 393(1825,-900) 394(1825,-890) 395(1825,-880) 396(1825,-870) 397(1825,-860) 398(1825,-850) 399(1825,-840) 400(1825,-830) 401(1825,-820) 402(1825,-810) 403(1825,-800) 404(1825,-790) 405(1825,-780) 406(1825,-770) 407(1825,-760) 408(1825,-750) 409(1825,-740) 410(1825,-730) 411(1825,-720) 412(1825,-710) 413(1825,-700) 414(1825,-690) 415(1825,-680) 416(1825,-670) 417(1825,-660) 418(1825,-650) 419(1825,-640) 420(1825,-630) 421(1825,-620) 422(1825,-610) 423(1825,-600) 424(1825,-590) 425(1825,-580) 426(1825,-570) 427(1825,-560) 428(1825,-550) 429(1825,-540) 430(1825,-530) 431(1825,-520) 432(1825,-510) 433(1825,-500) 434(1825,-490) 435(1825,-480) 436(1825,-470) 437(1825,-460) 438(1825,-450) 439(1825,-440) 440(1825,-430) 441(1825,-420) 442(1825,-410) 443(1825,-400) 444(1825,-390) 445(1825,-380) 446(1825,-370) 447(1825,-360) 448(1825,-350) 449(1825,-340) 450(1825,-330) 451(1825,-320) 452(1825,-310) 453(1825,-300) 454(1825,-290) 455(1825,-280) 456(1825,-270) 457(1825,-260) 458(1825,-250) 459(1825,-240) 460(1825,-230) 461(1825,-220) 462(1825,-210) 463(1825,-200) 464(1825,-190) 465(1825,-180) 466(1825,-170) 467(1825,-160) 468(1825,-150) 469(1825,-140) 470(1825,-130) 471(1825,-120) 472(1825,-110) 473(1825,-100) 474(1825,-90) 475(1825,-80) 476(1825,-70) 477(1825,-60) 478(1825,-50) 479(1825,-40) 480(1825,-30) 481(1825,-20) 482(1825,-10) 483(1825,0)
  oval 5x75 smd: 162(113,-1712) 163(123,-1712) 164(133,-1712) 165(143,-1712) 166(153,-1712) 167(163,-1712) 168(173,-1712) 169(183,-1712) 170(193,-1712) 171(203,-1712) 172(213,-1712) 173(223,-1712) 174(233,-1712) 175(243,-1712) 176(253,-1712) 177(263,-1712) 178(273,-1712) 179(283,-1712) 180(293,-1712) 181(303,-1712) 182(313,-1712) 183(323,-1712) 184(333,-1712) 185(343,-1712) 186(353,-1712) 187(363,-1712) 188(373,-1712) 189(383,-1712) 190(393,-1712) 191(403,-1712) 192(413,-1712) 193(423,-1712) 194(433,-1712) 195(443,-1712) 196(453,-1712) 197(463,-1712) 198(473,-1712) 199(483,-1712) 200(493,-1712) 201(503,-1712) 202(513,-1712) 203(523,-1712) 204(533,-1712) 205(543,-1712) 206(553,-1712) 207(563,-1712) 208(573,-1712) 209(583,-1712) 210(593,-1712) 211(603,-1712) 212(613,-1712) 213(623,-1712) 214(633,-1712) 215(643,-1712) 216(653,-1712) 217(663,-1712) 218(673,-1712) 219(683,-1712) 220(693,-1712) 221(703,-1712) 222(713,-1712) 223(723,-1712) 224(733,-1712) 225(743,-1712) 226(753,-1712) 227(763,-1712) 228(773,-1712) 229(783,-1712) 230(793,-1712) 231(803,-1712) 232(813,-1712) 233(823,-1712) 234(833,-1712) 235(843,-1712) 236(853,-1712) 237(863,-1712) 238(873,-1712) 239(883,-1712) 240(893,-1712) 241(903,-1712) 242(913,-1712) 243(923,-1712) 244(933,-1712) 245(943,-1712) 246(953,-1712) 247(963,-1712) 248(973,-1712) 249(983,-1712) 250(993,-1712) 251(1003,-1712) 252(1013,-1712) 253(1023,-1712) 254(1033,-1712) 255(1043,-1712) 256(1053,-1712) 257(1063,-1712) 258(1073,-1712) 259(1083,-1712) 260(1093,-1712) 261(1103,-1712) 262(1113,-1712) 263(1123,-1712) 264(1133,-1712) 265(1143,-1712) 266(1153,-1712) 267(1163,-1712) 268(1173,-1712) 269(1183,-1712) 270(1193,-1712) 271(1203,-1712) 272(1213,-1712) 273(1223,-1712) 274(1233,-1712) 275(1243,-1712) 276(1253,-1712) 277(1263,-1712) 278(1273,-1712) 279(1283,-1712) 280(1293,-1712) 281(1303,-1712) 282(1313,-1712) 283(1323,-1712) 284(1333,-1712) 285(1343,-1712) 286(1353,-1712) 287(1363,-1712) 288(1373,-1712) 289(1383,-1712) 290(1393,-1712) 291(1403,-1712) 292(1413,-1712) 293(1423,-1712) 294(1433,-1712) 295(1443,-1712) 296(1453,-1712) 297(1463,-1712) 298(1473,-1712) 299(1483,-1712) 300(1493,-1712) 301(1503,-1712) 302(1513,-1712) 303(1523,-1712) 304(1533,-1712) 305(1543,-1712) 306(1553,-1712) 307(1563,-1712) 308(1573,-1712) 309(1583,-1712) 310(1593,-1712) 311(1603,-1712) 312(1613,-1712) 313(1623,-1712) 314(1633,-1712) 315(1643,-1712) 316(1653,-1712) 317(1663,-1712) 318(1673,-1712) 319(1683,-1712) 320(1693,-1712) 321(1703,-1712) 322(1713,-1712) 484(1713,113) 485(1703,113) 486(1693,113) 487(1683,113) 488(1673,113) 489(1663,113) 490(1653,113) 491(1643,113) 492(1633,113) 493(1623,113) 494(1613,113) 495(1603,113) 496(1593,113) 497(1583,113) 498(1573,113) 499(1563,113) 500(1553,113) 501(1543,113) 502(1533,113) 503(1523,113) 504(1513,113) 505(1503,113) 506(1493,113) 507(1483,113) 508(1473,113) 509(1463,113) 510(1453,113) 511(1443,113) 512(1433,113) 513(1423,113) 514(1413,113) 515(1403,113) 516(1393,113) 517(1383,113) 518(1373,113) 519(1363,113) 520(1353,113) 521(1343,113) 522(1333,113) 523(1323,113) 524(1313,113) 525(1303,113) 526(1293,113) 527(1283,113) 528(1273,113) 529(1263,113) 530(1253,113) 531(1243,113) 532(1233,113) 533(1223,113) 534(1213,113) 535(1203,113) 536(1193,113) 537(1183,113) 538(1173,113) 539(1163,113) 540(1153,113) 541(1143,113) 542(1133,113) 543(1123,113) 544(1113,113) 545(1103,113) 546(1093,113) 547(1083,113) 548(1073,113) 549(1063,113) 550(1053,113) 551(1043,113) 552(1033,113) 553(1023,113) 554(1013,113) 555(1003,113) 556(993,113) 557(983,113) 558(973,113) 559(963,113) 560(953,113) 561(943,113) 562(933,113) 563(923,113) 564(913,113) 565(903,113) 566(893,113) 567(883,113) 568(873,113) 569(863,113) 570(853,113) 571(843,113) 572(833,113) 573(823,113) 574(813,113) 575(803,113) 576(793,113) 577(783,113) 578(773,113) 579(763,113) 580(753,113) 581(743,113) 582(733,113) 583(723,113) 584(713,113) 585(703,113) 586(693,113) 587(683,113) 588(673,113) 589(663,113) 590(653,113) 591(643,113) 592(633,113) 593(623,113) 594(613,113) 595(603,113) 596(593,113) 597(583,113) 598(573,113) 599(563,113) 600(553,113) 601(543,113) 602(533,113) 603(523,113) 604(513,113) 605(503,113) 606(493,113) 607(483,113) 608(473,113) 609(463,113) 610(453,113) 611(443,113) 612(433,113) 613(423,113) 614(413,113) 615(403,113) 616(393,113) 617(383,113) 618(373,113) 619(363,113) 620(353,113) 621(343,113) 622(333,113) 623(323,113) 624(313,113) 625(303,113) 626(293,113) 627(283,113) 628(273,113) 629(263,113) 630(253,113) 631(243,113) 632(233,113) 633(223,113) 634(213,113) 635(203,113) 636(193,113) 637(183,113) 638(173,113) 639(163,113) 640(153,113) 641(143,113) 642(133,113) 643(123,113) 644(113,113)

## TAPE724-10 [mil]
pads (724):
  oval 75x5 smd: 1(0,0) 2(0,-10) 3(0,-20) 4(0,-30) 5(0,-40) 6(0,-50) 7(0,-60) 8(0,-70) 9(0,-80) 10(0,-90) 11(0,-100) 12(0,-110) 13(0,-120) 14(0,-130) 15(0,-140) 16(0,-150) 17(0,-160) 18(0,-170) 19(0,-180) 20(0,-190) 21(0,-200) 22(0,-210) 23(0,-220) 24(0,-230) 25(0,-240) 26(0,-250) 27(0,-260) 28(0,-270) 29(0,-280) 30(0,-290) 31(0,-300) 32(0,-310) 33(0,-320) 34(0,-330) 35(0,-340) 36(0,-350) 37(0,-360) 38(0,-370) 39(0,-380) 40(0,-390) 41(0,-400) 42(0,-410) 43(0,-420) 44(0,-430) 45(0,-440) 46(0,-450) 47(0,-460) 48(0,-470) 49(0,-480) 50(0,-490) 51(0,-500) 52(0,-510) 53(0,-520) 54(0,-530) 55(0,-540) 56(0,-550) 57(0,-560) 58(0,-570) 59(0,-580) 60(0,-590) 61(0,-600) 62(0,-610) 63(0,-620) 64(0,-630) 65(0,-640) 66(0,-650) 67(0,-660) 68(0,-670) 69(0,-680) 70(0,-690) 71(0,-700) 72(0,-710) 73(0,-720) 74(0,-730) 75(0,-740) 76(0,-750) 77(0,-760) 78(0,-770) 79(0,-780) 80(0,-790) 81(0,-800) 82(0,-810) 83(0,-820) 84(0,-830) 85(0,-840) 86(0,-850) 87(0,-860) 88(0,-870) 89(0,-880) 90(0,-890) 91(0,-900) 92(0,-910) 93(0,-920) 94(0,-930) 95(0,-940) 96(0,-950) 97(0,-960) 98(0,-970) 99(0,-980) 100(0,-990) 101(0,-1000) 102(0,-1010) 103(0,-1020) 104(0,-1030) 105(0,-1040) 106(0,-1050) 107(0,-1060) 108(0,-1070) 109(0,-1080) 110(0,-1090) 111(0,-1100) 112(0,-1110) 113(0,-1120) 114(0,-1130) 115(0,-1140) 116(0,-1150) 117(0,-1160) 118(0,-1170) 119(0,-1180) 120(0,-1190) 121(0,-1200) 122(0,-1210) 123(0,-1220) 124(0,-1230) 125(0,-1240) 126(0,-1250) 127(0,-1260) 128(0,-1270) 129(0,-1280) 130(0,-1290) 131(0,-1300) 132(0,-1310) 133(0,-1320) 134(0,-1330) 135(0,-1340) 136(0,-1350) 137(0,-1360) 138(0,-1370) 139(0,-1380) 140(0,-1390) 141(0,-1400) 142(0,-1410) 143(0,-1420) 144(0,-1430) 145(0,-1440) 146(0,-1450) 147(0,-1460) 148(0,-1470) 149(0,-1480) 150(0,-1490) 151(0,-1500) 152(0,-1510) 153(0,-1520) 154(0,-1530) 155(0,-1540) 156(0,-1550) 157(0,-1560) 158(0,-1570) 159(0,-1580) 160(0,-1590) 161(0,-1600) 162(0,-1610) 163(0,-1620) 164(0,-1630) 165(0,-1640) 166(0,-1650) 167(0,-1660) 168(0,-1670) 169(0,-1680) 170(0,-1690) 171(0,-1700) 172(0,-1710) 173(0,-1720) 174(0,-1730) 175(0,-1740) 176(0,-1750) 177(0,-1760) 178(0,-1770) 179(0,-1780) 180(0,-1790) 181(0,-1800) 363(2025,-1800) 364(2025,-1790) 365(2025,-1780) 366(2025,-1770) 367(2025,-1760) 368(2025,-1750) 369(2025,-1740) 370(2025,-1730) 371(2025,-1720) 372(2025,-1710) 373(2025,-1700) 374(2025,-1690) 375(2025,-1680) 376(2025,-1670) 377(2025,-1660) 378(2025,-1650) 379(2025,-1640) 380(2025,-1630) 381(2025,-1620) 382(2025,-1610) 383(2025,-1600) 384(2025,-1590) 385(2025,-1580) 386(2025,-1570) 387(2025,-1560) 388(2025,-1550) 389(2025,-1540) 390(2025,-1530) 391(2025,-1520) 392(2025,-1510) 393(2025,-1500) 394(2025,-1490) 395(2025,-1480) 396(2025,-1470) 397(2025,-1460) 398(2025,-1450) 399(2025,-1440) 400(2025,-1430) 401(2025,-1420) 402(2025,-1410) 403(2025,-1400) 404(2025,-1390) 405(2025,-1380) 406(2025,-1370) 407(2025,-1360) 408(2025,-1350) 409(2025,-1340) 410(2025,-1330) 411(2025,-1320) 412(2025,-1310) 413(2025,-1300) 414(2025,-1290) 415(2025,-1280) 416(2025,-1270) 417(2025,-1260) 418(2025,-1250) 419(2025,-1240) 420(2025,-1230) 421(2025,-1220) 422(2025,-1210) 423(2025,-1200) 424(2025,-1190) 425(2025,-1180) 426(2025,-1170) 427(2025,-1160) 428(2025,-1150) 429(2025,-1140) 430(2025,-1130) 431(2025,-1120) 432(2025,-1110) 433(2025,-1100) 434(2025,-1090) 435(2025,-1080) 436(2025,-1070) 437(2025,-1060) 438(2025,-1050) 439(2025,-1040) 440(2025,-1030) 441(2025,-1020) 442(2025,-1010) 443(2025,-1000) 444(2025,-990) 445(2025,-980) 446(2025,-970) 447(2025,-960) 448(2025,-950) 449(2025,-940) 450(2025,-930) 451(2025,-920) 452(2025,-910) 453(2025,-900) 454(2025,-890) 455(2025,-880) 456(2025,-870) 457(2025,-860) 458(2025,-850) 459(2025,-840) 460(2025,-830) 461(2025,-820) 462(2025,-810) 463(2025,-800) 464(2025,-790) 465(2025,-780) 466(2025,-770) 467(2025,-760) 468(2025,-750) 469(2025,-740) 470(2025,-730) 471(2025,-720) 472(2025,-710) 473(2025,-700) 474(2025,-690) 475(2025,-680) 476(2025,-670) 477(2025,-660) 478(2025,-650) 479(2025,-640) 480(2025,-630) 481(2025,-620) 482(2025,-610) 483(2025,-600) 484(2025,-590) 485(2025,-580) 486(2025,-570) 487(2025,-560) 488(2025,-550) 489(2025,-540) 490(2025,-530) 491(2025,-520) 492(2025,-510) 493(2025,-500) 494(2025,-490) 495(2025,-480) 496(2025,-470) 497(2025,-460) 498(2025,-450) 499(2025,-440) 500(2025,-430) 501(2025,-420) 502(2025,-410) 503(2025,-400) 504(2025,-390) 505(2025,-380) 506(2025,-370) 507(2025,-360) 508(2025,-350) 509(2025,-340) 510(2025,-330) 511(2025,-320) 512(2025,-310) 513(2025,-300) 514(2025,-290) 515(2025,-280) 516(2025,-270) 517(2025,-260) 518(2025,-250) 519(2025,-240) 520(2025,-230) 521(2025,-220) 522(2025,-210) 523(2025,-200) 524(2025,-190) 525(2025,-180) 526(2025,-170) 527(2025,-160) 528(2025,-150) 529(2025,-140) 530(2025,-130) 531(2025,-120) 532(2025,-110) 533(2025,-100) 534(2025,-90) 535(2025,-80) 536(2025,-70) 537(2025,-60) 538(2025,-50) 539(2025,-40) 540(2025,-30) 541(2025,-20) 542(2025,-10) 543(2025,0)
  oval 5x75 smd: 182(113,-1912) 183(123,-1912) 184(133,-1912) 185(143,-1912) 186(153,-1912) 187(163,-1912) 188(173,-1912) 189(183,-1912) 190(193,-1912) 191(203,-1912) 192(213,-1912) 193(223,-1912) 194(233,-1912) 195(243,-1912) 196(253,-1912) 197(263,-1912) 198(273,-1912) 199(283,-1912) 200(293,-1912) 201(303,-1912) 202(313,-1912) 203(323,-1912) 204(333,-1912) 205(343,-1912) 206(353,-1912) 207(363,-1912) 208(373,-1912) 209(383,-1912) 210(393,-1912) 211(403,-1912) 212(413,-1912) 213(423,-1912) 214(433,-1912) 215(443,-1912) 216(453,-1912) 217(463,-1912) 218(473,-1912) 219(483,-1912) 220(493,-1912) 221(503,-1912) 222(513,-1912) 223(523,-1912) 224(533,-1912) 225(543,-1912) 226(553,-1912) 227(563,-1912) 228(573,-1912) 229(583,-1912) 230(593,-1912) 231(603,-1912) 232(613,-1912) 233(623,-1912) 234(633,-1912) 235(643,-1912) 236(653,-1912) 237(663,-1912) 238(673,-1912) 239(683,-1912) 240(693,-1912) 241(703,-1912) 242(713,-1912) 243(723,-1912) 244(733,-1912) 245(743,-1912) 246(753,-1912) 247(763,-1912) 248(773,-1912) 249(783,-1912) 250(793,-1912) 251(803,-1912) 252(813,-1912) 253(823,-1912) 254(833,-1912) 255(843,-1912) 256(853,-1912) 257(863,-1912) 258(873,-1912) 259(883,-1912) 260(893,-1912) 261(903,-1912) 262(913,-1912) 263(923,-1912) 264(933,-1912) 265(943,-1912) 266(953,-1912) 267(963,-1912) 268(973,-1912) 269(983,-1912) 270(993,-1912) 271(1003,-1912) 272(1013,-1912) 273(1023,-1912) 274(1033,-1912) 275(1043,-1912) 276(1053,-1912) 277(1063,-1912) 278(1073,-1912) 279(1083,-1912) 280(1093,-1912) 281(1103,-1912) 282(1113,-1912) 283(1123,-1912) 284(1133,-1912) 285(1143,-1912) 286(1153,-1912) 287(1163,-1912) 288(1173,-1912) 289(1183,-1912) 290(1193,-1912) 291(1203,-1912) 292(1213,-1912) 293(1223,-1912) 294(1233,-1912) 295(1243,-1912) 296(1253,-1912) 297(1263,-1912) 298(1273,-1912) 299(1283,-1912) 300(1293,-1912) 301(1303,-1912) 302(1313,-1912) 303(1323,-1912) 304(1333,-1912) 305(1343,-1912) 306(1353,-1912) 307(1363,-1912) 308(1373,-1912) 309(1383,-1912) 310(1393,-1912) 311(1403,-1912) 312(1413,-1912) 313(1423,-1912) 314(1433,-1912) 315(1443,-1912) 316(1453,-1912) 317(1463,-1912) 318(1473,-1912) 319(1483,-1912) 320(1493,-1912) 321(1503,-1912) 322(1513,-1912) 323(1523,-1912) 324(1533,-1912) 325(1543,-1912) 326(1553,-1912) 327(1563,-1912) 328(1573,-1912) 329(1583,-1912) 330(1593,-1912) 331(1603,-1912) 332(1613,-1912) 333(1623,-1912) 334(1633,-1912) 335(1643,-1912) 336(1653,-1912) 337(1663,-1912) 338(1673,-1912) 339(1683,-1912) 340(1693,-1912) 341(1703,-1912) 342(1713,-1912) 343(1723,-1912) 344(1733,-1912) 345(1743,-1912) 346(1753,-1912) 347(1763,-1912) 348(1773,-1912) 349(1783,-1912) 350(1793,-1912) 351(1803,-1912) 352(1813,-1912) 353(1823,-1912) 354(1833,-1912) 355(1843,-1912) 356(1853,-1912) 357(1863,-1912) 358(1873,-1912) 359(1883,-1912) 360(1893,-1912) 361(1903,-1912) 362(1913,-1912) 544(1913,113) 545(1903,113) 546(1893,113) 547(1883,113) 548(1873,113) 549(1863,113) 550(1853,113) 551(1843,113) 552(1833,113) 553(1823,113) 554(1813,113) 555(1803,113) 556(1793,113) 557(1783,113) 558(1773,113) 559(1763,113) 560(1753,113) 561(1743,113) 562(1733,113) 563(1723,113) 564(1713,113) 565(1703,113) 566(1693,113) 567(1683,113) 568(1673,113) 569(1663,113) 570(1653,113) 571(1643,113) 572(1633,113) 573(1623,113) 574(1613,113) 575(1603,113) 576(1593,113) 577(1583,113) 578(1573,113) 579(1563,113) 580(1553,113) 581(1543,113) 582(1533,113) 583(1523,113) 584(1513,113) 585(1503,113) 586(1493,113) 587(1483,113) 588(1473,113) 589(1463,113) 590(1453,113) 591(1443,113) 592(1433,113) 593(1423,113) 594(1413,113) 595(1403,113) 596(1393,113) 597(1383,113) 598(1373,113) 599(1363,113) 600(1353,113) 601(1343,113) 602(1333,113) 603(1323,113) 604(1313,113) 605(1303,113) 606(1293,113) 607(1283,113) 608(1273,113) 609(1263,113) 610(1253,113) 611(1243,113) 612(1233,113) 613(1223,113) 614(1213,113) 615(1203,113) 616(1193,113) 617(1183,113) 618(1173,113) 619(1163,113) 620(1153,113) 621(1143,113) 622(1133,113) 623(1123,113) 624(1113,113) 625(1103,113) 626(1093,113) 627(1083,113) 628(1073,113) 629(1063,113) 630(1053,113) 631(1043,113) 632(1033,113) 633(1023,113) 634(1013,113) 635(1003,113) 636(993,113) 637(983,113) 638(973,113) 639(963,113) 640(953,113) 641(943,113) 642(933,113) 643(923,113) 644(913,113) 645(903,113) 646(893,113) 647(883,113) 648(873,113) 649(863,113) 650(853,113) 651(843,113) 652(833,113) 653(823,113) 654(813,113) 655(803,113) 656(793,113) 657(783,113) 658(773,113) 659(763,113) 660(753,113) 661(743,113) 662(733,113) 663(723,113) 664(713,113) 665(703,113) 666(693,113) 667(683,113) 668(673,113) 669(663,113) 670(653,113) 671(643,113) 672(633,113) 673(623,113) 674(613,113) 675(603,113) 676(593,113) 677(583,113) 678(573,113) 679(563,113) 680(553,113) 681(543,113) 682(533,113) 683(523,113) 684(513,113) 685(503,113) 686(493,113) 687(483,113) 688(473,113) 689(463,113) 690(453,113) 691(443,113) 692(433,113) 693(423,113) 694(413,113) 695(403,113) 696(393,113) 697(383,113) 698(373,113) 699(363,113) 700(353,113) 701(343,113) 702(333,113) 703(323,113) 704(313,113) 705(303,113) 706(293,113) 707(283,113) 708(273,113) 709(263,113) 710(253,113) 711(243,113) 712(233,113) 713(223,113) 714(213,113) 715(203,113) 716(193,113) 717(183,113) 718(173,113) 719(163,113) 720(153,113) 721(143,113) 722(133,113) 723(123,113) 724(113,113)